# Altium footprint library CONN_HDR_1.27MM_ST.PcbLib: 116 footprints (part 5 of 9) (continued)
## HDRMINI_M_1X15 [mm] "mini header (50mil pitch)" (continued)
3D body: height 7.3, standoff -2.5, extent 6.15,-0.2 6.55,0.2
3D body: height 2.8, standoff 0, extent 4.445,-0.635 5.715,0.635
3D body: height 7.3, standoff -2.5, extent 4.88,-0.2 5.28,0.2
3D body: height 2.8, standoff 0, extent 3.175,-0.635 4.445,0.635
3D body: height 7.3, standoff -2.5, extent 3.61,-0.2 4.01,0.2

## HDRMINI_M_1X16 [mm] "mini header (50mil pitch)"
pads (16):
  round 1 / inner round 1 / far side oval 1x1.4 hole 0.7 mask+0.05: 1(-9.525,0) 2(-8.255,0) 3(-6.985,0) 4(-5.715,0) 5(-4.445,0) 6(-3.175,0) 7(-1.905,0) 8(-0.635,0) 9(0.635,0) 10(1.905,0) 11(3.175,0) 12(4.445,0) 13(5.715,0) 14(6.985,0) 15(8.255,0) 16(9.525,0)
Top Overlay:
  circle w0.2: c-10.668,0 r0.2
  lines w0.2: -10.16,-0.635 -10.061,-0.8 -8.989,-0.8 -8.89,-0.635 -8.791,-0.8 -7.719,-0.8 -7.62,-0.635 -7.521,-0.8 -6.449,-0.8 -6.35,-0.635 -6.251,-0.8 -5.179,-0.8 -5.08,-0.635 -4.981,-0.8 -3.909,-0.8 -3.81,-0.635 -3.711,-0.8 -2.639,-0.8 -2.54,-0.635 -2.441,-0.8 -1.369,-0.8 -1.27,-0.635 -1.171,-0.8 -0.099,-0.8 0,-0.635 0.099,-0.8 1.171,-0.8 1.27,-0.635 1.369,-0.8 2.441,-0.8 2.54,-0.635 2.639,-0.8 3.711,-0.8 3.81,-0.635 3.91,-0.8 4.982,-0.8 5.081,-0.635 5.18,-0.8 6.252,-0.8 6.351,-0.635 6.45,-0.8 7.522,-0.8 7.621,-0.635 7.72,-0.8 8.792,-0.8 8.891,-0.635 8.99,-0.8 10.062,-0.8 10.161,-0.635 10.161,0.635 10.062,0.8 8.99,0.8 8.891,0.635 8.792,0.8 7.72,0.8 7.621,0.635 7.522,0.8 6.45,0.8 6.351,0.635 6.252,0.8 5.18,0.8 5.081,0.635 4.982,0.8 3.91,0.8 3.811,0.635 3.711,0.8 2.639,0.8 2.54,0.635 2.441,0.8 1.369,0.8 1.27,0.635 1.171,0.8 0.099,0.8 0,0.635 -0.099,0.8 -1.171,0.8 -1.27,0.635 -1.369,0.8 -2.441,0.8 -2.54,0.635 -2.639,0.8 -3.711,0.8 -3.81,0.635 -3.909,0.8 -4.981,0.8 -5.08,0.635 -5.179,0.8 -6.251,0.8 -6.35,0.635 -6.449,0.8 -7.521,0.8 -7.62,0.635 -7.719,0.8 -8.791,0.8 -8.89,0.635 -8.989,0.8 -10.061,0.8 -10.16,0.635 -10.16,-0.635
3D body: height 2.8, standoff 0, extent 0,-0.635 1.27,0.635
3D body: height 7.3, standoff -2.5, extent 0.435,-0.2 0.835,0.2
3D body: height 2.8, standoff 0, extent -1.27,-0.635 0,0.635
3D body: height 7.3, standoff -2.5, extent -0.835,-0.2 -0.435,0.2
3D body: height 2.8, standoff 0, extent -2.54,-0.635 -1.27,0.635
3D body: height 7.3, standoff -2.5, extent -2.105,-0.2 -1.705,0.2
3D body: height 2.8, standoff 0, extent -3.81,-0.635 -2.54,0.635
3D body: height 7.3, standoff -2.5, extent -3.375,-0.2 -2.975,0.2
3D body: height 2.8, standoff 0, extent -5.08,-0.635 -3.81,0.635
3D body: height 7.3, standoff -2.5, extent -4.645,-0.2 -4.245,0.2
3D body: height 2.8, standoff 0, extent -6.35,-0.635 -5.08,0.635
3D body: height 7.3, standoff -2.5, extent -5.915,-0.2 -5.515,0.2
3D body: height 2.8, standoff 0, extent -7.62,-0.635 -6.35,0.635
3D body: height 7.3, standoff -2.5, extent -7.185,-0.2 -6.785,0.2
3D body: height 2.8, standoff 0, extent -8.89,-0.635 -7.62,0.635
3D body: height 7.3, standoff -2.5, extent -8.455,-0.2 -8.055,0.2
3D body: height 2.8, standoff 0, extent -10.16,-0.635 -8.89,0.635
3D body: height 7.3, standoff -2.5, extent -9.725,-0.2 -9.325,0.2
3D body: height 2.8, standoff 0, extent 1.27,-0.635 2.54,0.635
3D body: height 7.3, standoff -2.5, extent 1.705,-0.2 2.105,0.2
3D body: height 2.8, standoff 0, extent 8.89,-0.635 10.16,0.635
3D body: height 7.3, standoff -2.5, extent 9.325,-0.2 9.725,0.2
3D body: height 2.8, standoff 0, extent 7.62,-0.635 8.89,0.635
3D body: height 7.3, standoff -2.5, extent 8.055,-0.2 8.455,0.2
3D body: height 2.8, standoff 0, extent 6.35,-0.635 7.62,0.635
3D body: height 7.3, standoff -2.5, extent 6.785,-0.2 7.185,0.2
3D body: height 2.8, standoff 0, extent 5.08,-0.635 6.35,0.635
3D body: height 7.3, standoff -2.5, extent 5.515,-0.2 5.915,0.2
3D body: height 2.8, standoff 0, extent 3.81,-0.635 5.08,0.635
3D body: height 7.3, standoff -2.5, extent 4.245,-0.2 4.645,0.2
3D body: height 2.8, standoff 0, extent 2.54,-0.635 3.81,0.635
3D body: height 7.3, standoff -2.5, extent 2.975,-0.2 3.375,0.2

## HDRMINI_M_1X17 [mm] "mini header (50mil pitch)"
pads (17):
  round 1 / inner round 1 / far side oval 1x1.4 hole 0.7 mask+0.05: 1(-10.16,0) 2(-8.89,0) 3(-7.62,0) 4(-6.35,0) 5(-5.08,0) 6(-3.81,0) 7(-2.54,0) 8(-1.27,0) 9(0,0) 10(1.27,0) 11(2.54,0) 12(3.81,0) 13(5.08,0) 14(6.35,0) 15(7.62,0) 16(8.89,0) 17(10.16,0)
Top Overlay:
  circle w0.2: c-11.303,0 r0.2
  lines w0.2: -10.795,-0.635 -10.696,-0.8 -9.624,-0.8 -9.525,-0.635 -9.426,-0.8 -8.354,-0.8 -8.255,-0.635 -8.156,-0.8 -7.084,-0.8 -6.985,-0.635 -6.886,-0.8 -5.814,-0.8 -5.715,-0.635 -5.616,-0.8 -4.544,-0.8 -4.445,-0.635 -4.346,-0.8 -3.274,-0.8 -3.175,-0.635 -3.076,-0.8 -2.004,-0.8 -1.905,-0.635 -1.806,-0.8 -0.734,-0.8 -0.635,-0.635 -0.536,-0.8 0.536,-0.8 0.635,-0.635 0.734,-0.8 1.806,-0.8 1.905,-0.635 2.004,-0.8 3.076,-0.8 3.175,-0.635 3.275,-0.8 4.347,-0.8 4.446,-0.635 4.545,-0.8 5.617,-0.8 5.716,-0.635 5.815,-0.8 6.887,-0.8 6.986,-0.635 7.085,-0.8 8.157,-0.8 8.256,-0.635 8.355,-0.8 9.427,-0.8 9.526,-0.635 9.625,-0.8 10.697,-0.8 10.796,-0.635 10.796,0.635 10.697,0.8 9.625,0.8 9.526,0.635 9.427,0.8 8.355,0.8 8.256,0.635 8.157,0.8 7.085,0.8 6.986,0.635 6.887,0.8 5.815,0.8 5.716,0.635 5.617,0.8 4.545,0.8 4.446,0.635 4.347,0.8 3.275,0.8 3.176,0.635 3.076,0.8 2.004,0.8 1.905,0.635 1.806,0.8 0.734,0.8 0.635,0.635 0.536,0.8 -0.536,0.8 -0.635,0.635 -0.734,0.8 -1.806,0.8 -1.905,0.635 -2.004,0.8 -3.076,0.8 -3.175,0.635 -3.274,0.8 -4.346,0.8 -4.445,0.635 -4.544,0.8 -5.616,0.8 -5.715,0.635 -5.814,0.8 -6.886,0.8 -6.985,0.635 -7.084,0.8 -8.156,0.8 -8.255,0.635 -8.354,0.8 -9.426,0.8 -9.525,0.635 -9.624,0.8 -10.696,0.8 -10.795,0.635 -10.795,-0.635
3D body: height 2.8, standoff 0, extent -0.635,-0.635 0.635,0.635
3D body: height 7.3, standoff -2.5, extent -0.2,-0.2 0.2,0.2
3D body: height 2.8, standoff 0, extent -1.905,-0.635 -0.635,0.635
3D body: height 7.3, standoff -2.5, extent -1.47,-0.2 -1.07,0.2
3D body: height 2.8, standoff 0, extent -3.175,-0.635 -1.905,0.635
3D body: height 7.3, standoff -2.5, extent -2.74,-0.2 -2.34,0.2
3D body: height 2.8, standoff 0, extent -4.445,-0.635 -3.175,0.635
3D body: height 7.3, standoff -2.5, extent -4.01,-0.2 -3.61,0.2
3D body: height 2.8, standoff 0, extent -5.715,-0.635 -4.445,0.635
3D body: height 7.3, standoff -2.5, extent -5.28,-0.2 -4.88,0.2
3D body: height 2.8, standoff 0, extent -6.985,-0.635 -5.715,0.635
3D body: height 7.3, standoff -2.5, extent -6.55,-0.2 -6.15,0.2
3D body: height 2.8, standoff 0, extent -8.255,-0.635 -6.985,0.635
3D body: height 7.3, standoff -2.5, extent -7.82,-0.2 -7.42,0.2
3D body: height 2.8, standoff 0, extent -9.525,-0.635 -8.255,0.635
3D body: height 7.3, standoff -2.5, extent -9.09,-0.2 -8.69,0.2
3D body: height 2.8, standoff 0, extent -10.795,-0.635 -9.525,0.635
3D body: height 7.3, standoff -2.5, extent -10.36,-0.2 -9.96,0.2
3D body: height 2.8, standoff 0, extent 0.635,-0.635 1.905,0.635
3D body: height 7.3, standoff -2.5, extent 1.07,-0.2 1.47,0.2
3D body: height 2.8, standoff 0, extent 9.525,-0.635 10.795,0.635
3D body: height 7.3, standoff -2.5, extent 9.96,-0.2 10.36,0.2
3D body: height 2.8, standoff 0, extent 8.255,-0.635 9.525,0.635
3D body: height 7.3, standoff -2.5, extent 8.69,-0.2 9.09,0.2
3D body: height 2.8, standoff 0, extent 6.985,-0.635 8.255,0.635
3D body: height 7.3, standoff -2.5, extent 7.42,-0.2 7.82,0.2
3D body: height 2.8, standoff 0, extent 5.715,-0.635 6.985,0.635
3D body: height 7.3, standoff -2.5, extent 6.15,-0.2 6.55,0.2
3D body: height 2.8, standoff 0, extent 4.445,-0.635 5.715,0.635
3D body: height 7.3, standoff -2.5, extent 4.88,-0.2 5.28,0.2
3D body: height 2.8, standoff 0, extent 3.175,-0.635 4.445,0.635
3D body: height 7.3, standoff -2.5, extent 3.61,-0.2 4.01,0.2
3D body: height 2.8, standoff 0, extent 1.905,-0.635 3.175,0.635
3D body: height 7.3, standoff -2.5, extent 2.34,-0.2 2.74,0.2

## HDRMINI_M_1X18 [mm] "mini header (50mil pitch)"
pads (18):
  round 1 / inner round 1 / far side oval 1x1.4 hole 0.7 mask+0.05: 1(-10.795,0) 2(-9.525,0) 3(-8.255,0) 4(-6.985,0) 5(-5.715,0) 6(-4.445,0) 7(-3.175,0) 8(-1.905,0) 9(-0.635,0) 10(0.635,0) 11(1.905,0) 12(3.175,0) 13(4.445,0) 14(5.715,0) 15(6.985,0) 16(8.255,0) 17(9.525,0) 18(10.795,0)
Top Overlay:
  circle w0.2: c-11.938,0 r0.2
  lines w0.2: -11.43,-0.635 -11.43,0.635 -11.331,0.8 -10.259,0.8 -10.16,0.635 -10.061,0.8 -8.989,0.8 -8.89,0.635 -8.791,0.8 -7.719,0.8 -7.62,0.635 -7.521,0.8 -6.449,0.8 -6.35,0.635 -6.251,0.8 -5.179,0.8 -5.08,0.635 -4.981,0.8 -3.909,0.8 -3.81,0.635 -3.711,0.8 -2.639,0.8 -2.54,0.635 -2.441,0.8 -1.369,0.8 -1.27,0.635 -1.171,0.8 -0.099,0.8 0,0.635 0.099,0.8 1.171,0.8 1.27,0.635 1.369,0.8 2.441,0.8 2.54,0.635 2.64,0.8 3.712,0.8 3.811,0.635 3.91,0.8 4.982,0.8 5.081,0.635 5.18,0.8 6.252,0.8 6.351,0.635 6.45,0.8 7.522,0.8 7.621,0.635 7.72,0.8 8.792,0.8 8.891,0.635 8.99,0.8 10.062,0.8 10.161,0.635 10.26,0.8 11.332,0.8 11.431,0.635 11.431,-0.635 11.332,-0.8 10.26,-0.8 10.161,-0.635 10.062,-0.8 8.99,-0.8 8.891,-0.635 8.792,-0.8 7.72,-0.8 7.621,-0.635 7.522,-0.8 6.45,-0.8 6.351,-0.635 6.252,-0.8 5.18,-0.8 5.081,-0.635 4.982,-0.8 3.91,-0.8 3.811,-0.635 3.712,-0.8 2.64,-0.8 2.541,-0.635 2.441,-0.8 1.369,-0.8 1.27,-0.635 1.171,-0.8 0.099,-0.8 0,-0.635 -0.099,-0.8 -1.171,-0.8 -1.27,-0.635 -1.369,-0.8 -2.441,-0.8 -2.54,-0.635 -2.639,-0.8 -3.711,-0.8 -3.81,-0.635 -3.909,-0.8 -4.981,-0.8 -5.08,-0.635 -5.179,-0.8 -6.251,-0.8 -6.35,-0.635 -6.449,-0.8 -7.521,-0.8 -7.62,-0.635 -7.719,-0.8 -8.791,-0.8 -8.89,-0.635 -8.989,-0.8 -10.061,-0.8 -10.16,-0.635 -10.259,-0.8 -11.331,-0.8 -11.43,-0.635
3D body: height 2.8, standoff 0, extent -1.27,-0.635 0,0.635
3D body: height 7.3, standoff -2.5, extent -0.835,-0.2 -0.435,0.2
3D body: height 2.8, standoff 0, extent -2.54,-0.635 -1.27,0.635
3D body: height 7.3, standoff -2.5, extent -2.105,-0.2 -1.705,0.2
3D body: height 2.8, standoff 0, extent -3.81,-0.635 -2.54,0.635
3D body: height 7.3, standoff -2.5, extent -3.375,-0.2 -2.975,0.2
3D body: height 2.8, standoff 0, extent -5.08,-0.635 -3.81,0.635
3D body: height 7.3, standoff -2.5, extent -4.645,-0.2 -4.245,0.2
3D body: height 2.8, standoff 0, extent -6.35,-0.635 -5.08,0.635
3D body: height 7.3, standoff -2.5, extent -5.915,-0.2 -5.515,0.2
3D body: height 2.8, standoff 0, extent -7.62,-0.635 -6.35,0.635
3D body: height 7.3, standoff -2.5, extent -7.185,-0.2 -6.785,0.2
3D body: height 2.8, standoff 0, extent -8.89,-0.635 -7.62,0.635
3D body: height 7.3, standoff -2.5, extent -8.455,-0.2 -8.055,0.2
3D body: height 2.8, standoff 0, extent -10.16,-0.635 -8.89,0.635
3D body: height 7.3, standoff -2.5, extent -9.725,-0.2 -9.325,0.2
3D body: height 2.8, standoff 0, extent -11.43,-0.635 -10.16,0.635
3D body: height 7.3, standoff -2.5, extent -10.995,-0.2 -10.595,0.2
3D body: height 2.8, standoff 0, extent 0,-0.635 1.27,0.635
3D body: height 7.3, standoff -2.5, extent 0.435,-0.2 0.835,0.2
3D body: height 2.8, standoff 0, extent 10.16,-0.635 11.43,0.635
3D body: height 7.3, standoff -2.5, extent 10.595,-0.2 10.995,0.2
3D body: height 2.8, standoff 0, extent 8.89,-0.635 10.16,0.635
3D body: height 7.3, standoff -2.5, extent 9.325,-0.2 9.725,0.2
3D body: height 2.8, standoff 0, extent 7.62,-0.635 8.89,0.635
3D body: height 7.3, standoff -2.5, extent 8.055,-0.2 8.455,0.2
3D body: height 2.8, standoff 0, extent 6.35,-0.635 7.62,0.635
3D body: height 7.3, standoff -2.5, extent 6.785,-0.2 7.185,0.2
3D body: height 2.8, standoff 0, extent 5.08,-0.635 6.35,0.635
3D body: height 7.3, standoff -2.5, extent 5.515,-0.2 5.915,0.2
3D body: height 2.8, standoff 0, extent 3.81,-0.635 5.08,0.635
3D body: height 7.3, standoff -2.5, extent 4.245,-0.2 4.645,0.2
3D body: height 2.8, standoff 0, extent 2.54,-0.635 3.81,0.635
3D body: height 7.3, standoff -2.5, extent 2.975,-0.2 3.375,0.2
3D body: height 2.8, standoff 0, extent 1.27,-0.635 2.54,0.635
3D body: height 7.3, standoff -2.5, extent 1.705,-0.2 2.105,0.2

## HDRMINI_M_1X19 [mm] "mini header (50mil pitch)"
pads (19):
  round 1 / inner round 1 / far side oval 1x1.4 hole 0.7 mask+0.05: 1(-11.43,0) 2(-10.16,0) 3(-8.89,0) 4(-7.62,0) 5(-6.35,0) 6(-5.08,0) 7(-3.81,0) 8(-2.54,0) 9(-1.27,0) 10(0,0) 11(1.27,0) 12(2.54,0) 13(3.81,0) 14(5.08,0) 15(6.35,0) 16(7.62,0) 17(8.89,0) 18(10.16,0) 19(11.43,0)
Top Overlay:
  circle w0.2: c-12.573,0 r0.2
  lines w0.2: -12.065,-0.635 -12.065,0.635 -11.966,0.8 -10.894,0.8 -10.795,0.635 -10.696,0.8 -9.624,0.8 -9.525,0.635 -9.426,0.8 -8.354,0.8 -8.255,0.635 -8.156,0.8 -7.084,0.8 -6.985,0.635 -6.886,0.8 -5.814,0.8 -5.715,0.635 -5.616,0.8 -4.544,0.8 -4.445,0.635 -4.346,0.8 -3.274,0.8 -3.175,0.635 -3.076,0.8 -2.004,0.8 -1.905,0.635 -1.806,0.8 -0.734,0.8 -0.635,0.635 -0.536,0.8 0.536,0.8 0.635,0.635 0.734,0.8 1.806,0.8 1.905,0.635 2.005,0.8 3.077,0.8 3.176,0.635 3.275,0.8 4.347,0.8 4.446,0.635 4.545,0.8 5.617,0.8 5.716,0.635 5.815,0.8 6.887,0.8 6.986,0.635 7.085,0.8 8.157,0.8 8.256,0.635 8.355,0.8 9.427,0.8 9.526,0.635 9.625,0.8 10.697,0.8 10.796,0.635 10.895,0.8 11.967,0.8 12.066,0.635 12.066,-0.635 11.967,-0.8 10.895,-0.8 10.796,-0.635 10.697,-0.8 9.625,-0.8 9.526,-0.635 9.427,-0.8 8.355,-0.8 8.256,-0.635 8.157,-0.8 7.085,-0.8 6.986,-0.635 6.887,-0.8 5.815,-0.8 5.716,-0.635 5.617,-0.8 4.545,-0.8 4.446,-0.635 4.347,-0.8 3.275,-0.8 3.176,-0.635 3.077,-0.8 2.005,-0.8 1.906,-0.635 1.806,-0.8 0.734,-0.8 0.635,-0.635 0.536,-0.8 -0.536,-0.8 -0.635,-0.635 -0.734,-0.8 -1.806,-0.8 -1.905,-0.635 -2.004,-0.8 -3.076,-0.8 -3.175,-0.635 -3.274,-0.8 -4.346,-0.8 -4.445,-0.635 -4.544,-0.8 -5.616,-0.8 -5.715,-0.635 -5.814,-0.8 -6.886,-0.8 -6.985,-0.635 -7.084,-0.8 -8.156,-0.8 -8.255,-0.635 -8.354,-0.8 -9.426,-0.8 -9.525,-0.635 -9.624,-0.8 -10.696,-0.8 -10.795,-0.635 -10.894,-0.8 -11.966,-0.8 -12.065,-0.635
3D body: height 2.8, standoff 0, extent -1.905,-0.635 -0.635,0.635
3D body: height 7.3, standoff -2.5, extent -1.47,-0.2 -1.07,0.2
3D body: height 2.8, standoff 0, extent -3.175,-0.635 -1.905,0.635
3D body: height 7.3, standoff -2.5, extent -2.74,-0.2 -2.34,0.2
3D body: height 2.8, standoff 0, extent -4.445,-0.635 -3.175,0.635
3D body: height 7.3, standoff -2.5, extent -4.01,-0.2 -3.61,0.2
3D body: height 2.8, standoff 0, extent -5.715,-0.635 -4.445,0.635
3D body: height 7.3, standoff -2.5, extent -5.28,-0.2 -4.88,0.2
3D body: height 2.8, standoff 0, extent -6.985,-0.635 -5.715,0.635
3D body: height 7.3, standoff -2.5, extent -6.55,-0.2 -6.15,0.2
3D body: height 2.8, standoff 0, extent -8.255,-0.635 -6.985,0.635
3D body: height 7.3, standoff -2.5, extent -7.82,-0.2 -7.42,0.2
3D body: height 2.8, standoff 0, extent -9.525,-0.635 -8.255,0.635
3D body: height 7.3, standoff -2.5, extent -9.09,-0.2 -8.69,0.2
3D body: height 2.8, standoff 0, extent -10.795,-0.635 -9.525,0.635
3D body: height 7.3, standoff -2.5, extent -10.36,-0.2 -9.96,0.2
3D body: height 2.8, standoff 0, extent -12.065,-0.635 -10.795,0.635
3D body: height 7.3, standoff -2.5, extent -11.63,-0.2 -11.23,0.2
3D body: height 2.8, standoff 0, extent -0.635,-0.635 0.635,0.635
3D body: height 7.3, standoff -2.5, extent -0.2,-0.2 0.2,0.2
3D body: height 2.8, standoff 0, extent 10.795,-0.635 12.065,0.635
3D body: height 7.3, standoff -2.5, extent 11.23,-0.2 11.63,0.2
3D body: height 2.8, standoff 0, extent 9.525,-0.635 10.795,0.635
3D body: height 7.3, standoff -2.5, extent 9.96,-0.2 10.36,0.2
3D body: height 2.8, standoff 0, extent 8.255,-0.635 9.525,0.635
3D body: height 7.3, standoff -2.5, extent 8.69,-0.2 9.09,0.2
3D body: height 2.8, standoff 0, extent 6.985,-0.635 8.255,0.635
3D body: height 7.3, standoff -2.5, extent 7.42,-0.2 7.82,0.2
3D body: height 2.8, standoff 0, extent 5.715,-0.635 6.985,0.635
3D body: height 7.3, standoff -2.5, extent 6.15,-0.2 6.55,0.2
3D body: height 2.8, standoff 0, extent 4.445,-0.635 5.715,0.635
3D body: height 7.3, standoff -2.5, extent 4.88,-0.2 5.28,0.2
3D body: height 2.8, standoff 0, extent 3.175,-0.635 4.445,0.635
3D body: height 7.3, standoff -2.5, extent 3.61,-0.2 4.01,0.2
3D body: height 2.8, standoff 0, extent 1.905,-0.635 3.175,0.635
3D body: height 7.3, standoff -2.5, extent 2.34,-0.2 2.74,0.2
3D body: height 2.8, standoff 0, extent 0.635,-0.635 1.905,0.635
3D body: height 7.3, standoff -2.5, extent 1.07,-0.2 1.47,0.2

## HDRMINI_M_1X20 [mm] "mini header (50mil pitch)"
pads (20):
  round 1 / inner round 1 / far side oval 1x1.4 hole 0.7 mask+0.05: 1(-12.065,0) 2(-10.795,0) 3(-9.525,0) 4(-8.255,0) 5(-6.985,0) 6(-5.715,0) 7(-4.445,0) 8(-3.175,0) 9(-1.905,0) 10(-0.635,0) 11(0.635,0) 12(1.905,0) 13(3.175,0) 14(4.445,0) 15(5.715,0) 16(6.985,0) 17(8.255,0) 18(9.525,0) 19(10.795,0) 20(12.065,0)
Top Overlay:
  circle w0.2: c-13.208,0 r0.2
  lines w0.2: -12.7,-0.635 -12.601,-0.8 -11.529,-0.8 -11.43,-0.635 -11.331,-0.8 -10.259,-0.8 -10.16,-0.635 -10.061,-0.8 -8.989,-0.8 -8.89,-0.635 -8.791,-0.8 -7.719,-0.8 -7.62,-0.635 -7.521,-0.8 -6.449,-0.8 -6.35,-0.635 -6.251,-0.8 -5.179,-0.8 -5.08,-0.635 -4.981,-0.8 -3.909,-0.8 -3.81,-0.635 -3.711,-0.8 -2.639,-0.8 -2.54,-0.635 -2.441,-0.8 -1.369,-0.8 -1.27,-0.635 -1.171,-0.8 -0.099,-0.8 0,-0.635 0.099,-0.8 1.171,-0.8 1.27,-0.635 1.37,-0.8 2.442,-0.8 2.541,-0.635 2.64,-0.8 3.712,-0.8 3.811,-0.635 3.91,-0.8 4.982,-0.8 5.081,-0.635 5.18,-0.8 6.252,-0.8 6.351,-0.635 6.45,-0.8 7.522,-0.8 7.621,-0.635 7.72,-0.8 8.792,-0.8 8.891,-0.635 8.99,-0.8 10.062,-0.8 10.161,-0.635 10.26,-0.8 11.332,-0.8 11.431,-0.635 11.53,-0.8 12.602,-0.8 12.701,-0.635 12.701,0.635 12.602,0.8 11.53,0.8 11.431,0.635 11.332,0.8 10.26,0.8 10.161,0.635 10.062,0.8 8.99,0.8 8.891,0.635 8.792,0.8 7.72,0.8 7.621,0.635 7.522,0.8 6.45,0.8 6.351,0.635 6.252,0.8 5.18,0.8 5.081,0.635 4.982,0.8 3.91,0.8 3.811,0.635 3.712,0.8 2.64,0.8 2.541,0.635 2.442,0.8 1.37,0.8 1.271,0.635 1.171,0.8 0.099,0.8 0,0.635 -0.099,0.8 -1.171,0.8 -1.27,0.635 -1.369,0.8 -2.441,0.8 -2.54,0.635 -2.639,0.8 -3.711,0.8 -3.81,0.635 -3.909,0.8 -4.981,0.8 -5.08,0.635 -5.179,0.8 -6.251,0.8 -6.35,0.635 -6.449,0.8 -7.521,0.8 -7.62,0.635 -7.719,0.8 -8.791,0.8 -8.89,0.635 -8.989,0.8 -10.061,0.8 -10.16,0.635 -10.259,0.8 -11.331,0.8 -11.43,0.635 -11.529,0.8 -12.601,0.8 -12.7,0.635 -12.7,-0.635
3D body: height 7.3, standoff -2.5, extent 11.865,-0.2 12.265,0.2
3D body: height 2.8, standoff 0, extent 11.43,-0.635 12.7,0.635
3D body: height 7.3, standoff -2.5, extent 0.435,-0.2 0.835,0.2
3D body: height 2.8, standoff 0, extent 0,-0.635 1.27,0.635
3D body: height 7.3, standoff -2.5, extent 1.705,-0.2 2.105,0.2
3D body: height 2.8, standoff 0, extent 1.27,-0.635 2.54,0.635
3D body: height 7.3, standoff -2.5, extent 2.975,-0.2 3.375,0.2
3D body: height 2.8, standoff 0, extent 2.54,-0.635 3.81,0.635
3D body: height 7.3, standoff -2.5, extent 4.245,-0.2 4.645,0.2
3D body: height 2.8, standoff 0, extent 3.81,-0.635 5.08,0.635
3D body: height 7.3, standoff -2.5, extent 5.515,-0.2 5.915,0.2
3D body: height 2.8, standoff 0, extent 5.08,-0.635 6.35,0.635
3D body: height 7.3, standoff -2.5, extent 6.785,-0.2 7.185,0.2
3D body: height 2.8, standoff 0, extent 6.35,-0.635 7.62,0.635
3D body: height 7.3, standoff -2.5, extent 8.055,-0.2 8.455,0.2
3D body: height 2.8, standoff 0, extent 7.62,-0.635 8.89,0.635
3D body: height 7.3, standoff -2.5, extent 9.325,-0.2 9.725,0.2
3D body: height 2.8, standoff 0, extent 8.89,-0.635 10.16,0.635
3D body: height 7.3, standoff -2.5, extent 10.595,-0.2 10.995,0.2
3D body: height 2.8, standoff 0, extent 10.16,-0.635 11.43,0.635
3D body: height 7.3, standoff -2.5, extent -0.835,-0.2 -0.435,0.2
3D body: height 2.8, standoff 0, extent -1.27,-0.635 0,0.635
3D body: height 7.3, standoff -2.5, extent -12.265,-0.2 -11.865,0.2
3D body: height 2.8, standoff 0, extent -12.7,-0.635 -11.43,0.635
3D body: height 7.3, standoff -2.5, extent -10.995,-0.2 -10.595,0.2
3D body: height 2.8, standoff 0, extent -11.43,-0.635 -10.16,0.635
3D body: height 7.3, standoff -2.5, extent -9.725,-0.2 -9.325,0.2
3D body: height 2.8, standoff 0, extent -10.16,-0.635 -8.89,0.635
3D body: height 7.3, standoff -2.5, extent -8.455,-0.2 -8.055,0.2
3D body: height 2.8, standoff 0, extent -8.89,-0.635 -7.62,0.635
3D body: height 7.3, standoff -2.5, extent -7.185,-0.2 -6.785,0.2
3D body: height 2.8, standoff 0, extent -7.62,-0.635 -6.35,0.635
3D body: height 7.3, standoff -2.5, extent -5.915,-0.2 -5.515,0.2
3D body: height 2.8, standoff 0, extent -6.35,-0.635 -5.08,0.635
3D body: height 7.3, standoff -2.5, extent -4.645,-0.2 -4.245,0.2
3D body: height 2.8, standoff 0, extent -5.08,-0.635 -3.81,0.635
3D body: height 7.3, standoff -2.5, extent -3.375,-0.2 -2.975,0.2
3D body: height 2.8, standoff 0, extent -3.81,-0.635 -2.54,0.635
3D body: height 7.3, standoff -2.5, extent -2.105,-0.2 -1.705,0.2
3D body: height 2.8, standoff 0, extent -2.54,-0.635 -1.27,0.635

## HDRMINI_M_1X21 [mm] "mini header (50mil pitch)"
pads (21):
  round 1 / inner round 1 / far side oval 1x1.4 hole 0.7 mask+0.05: 1(-12.7,0) 2(-11.43,0) 3(-10.16,0) 4(-8.89,0) 5(-7.62,0) 6(-6.35,0) 7(-5.08,0) 8(-3.81,0) 9(-2.54,0) 10(-1.27,0) 11(0,0) 12(1.27,0) 13(2.54,0) 14(3.81,0) 15(5.08,0) 16(6.35,0) 17(7.62,0) 18(8.89,0) 19(10.16,0) 20(11.43,0) 21(12.7,0)
Top Overlay:
  circle w0.2: c-13.843,0 r0.2
  lines w0.2: -13.335,-0.635 -13.335,0.635 -13.236,0.8 -12.164,0.8 -12.065,0.635 -11.966,0.8 -10.894,0.8 -10.795,0.635 -10.696,0.8 -9.624,0.8 -9.525,0.635 -9.426,0.8 -8.354,0.8 -8.255,0.635 -8.156,0.8 -7.084,0.8 -6.985,0.635 -6.886,0.8 -5.814,0.8 -5.715,0.635 -5.616,0.8 -4.544,0.8 -4.445,0.635 -4.346,0.8 -3.274,0.8 -3.175,0.635 -3.076,0.8 -2.004,0.8 -1.905,0.635 -1.806,0.8 -0.734,0.8 -0.635,0.635 -0.536,0.8 0.536,0.8 0.635,0.635 0.735,0.8 1.807,0.8 1.906,0.635 2.005,0.8 3.077,0.8 3.176,0.635 3.275,0.8 4.347,0.8 4.446,0.635 4.545,0.8 5.617,0.8 5.716,0.635 5.815,0.8 6.887,0.8 6.986,0.635 7.085,0.8 8.157,0.8 8.256,0.635 8.355,0.8 9.427,0.8 9.526,0.635 9.625,0.8 10.697,0.8 10.796,0.635 10.895,0.8 11.967,0.8 12.066,0.635 12.165,0.8 13.237,0.8 13.336,0.635 13.336,-0.635 13.237,-0.8 12.165,-0.8 12.066,-0.635 11.967,-0.8 10.895,-0.8 10.796,-0.635 10.697,-0.8 9.625,-0.8 9.526,-0.635 9.427,-0.8 8.355,-0.8 8.256,-0.635 8.157,-0.8 7.085,-0.8 6.986,-0.635 6.887,-0.8 5.815,-0.8 5.716,-0.635 5.617,-0.8 4.545,-0.8 4.446,-0.635 4.347,-0.8 3.275,-0.8 3.176,-0.635 3.077,-0.8 2.005,-0.8 1.906,-0.635 1.807,-0.8 0.735,-0.8 0.636,-0.635 0.536,-0.8 -0.536,-0.8 -0.635,-0.635 -0.734,-0.8 -1.806,-0.8 -1.905,-0.635 -2.004,-0.8 -3.076,-0.8 -3.175,-0.635 -3.274,-0.8 -4.346,-0.8 -4.445,-0.635 -4.544,-0.8 -5.616,-0.8 -5.715,-0.635 -5.814,-0.8 -6.886,-0.8 -6.985,-0.635 -7.084,-0.8 -8.156,-0.8 -8.255,-0.635 -8.354,-0.8 -9.426,-0.8 -9.525,-0.635 -9.624,-0.8 -10.696,-0.8 -10.795,-0.635 -10.894,-0.8 -11.966,-0.8 -12.065,-0.635 -12.164,-0.8 -13.236,-0.8 -13.335,-0.635
3D body: height 7.3, standoff -2.5, extent 11.23,-0.2 11.63,0.2
3D body: height 2.8, standoff 0, extent 10.795,-0.635 12.065,0.635
3D body: height 7.3, standoff -2.5, extent -0.2,-0.2 0.2,0.2
3D body: height 2.8, standoff 0, extent -0.635,-0.635 0.635,0.635
3D body: height 7.3, standoff -2.5, extent 1.07,-0.2 1.47,0.2
3D body: height 2.8, standoff 0, extent 0.635,-0.635 1.905,0.635
3D body: height 7.3, standoff -2.5, extent 2.34,-0.2 2.74,0.2
3D body: height 2.8, standoff 0, extent 1.905,-0.635 3.175,0.635
3D body: height 7.3, standoff -2.5, extent 3.61,-0.2 4.01,0.2
3D body: height 2.8, standoff 0, extent 3.175,-0.635 4.445,0.635
3D body: height 7.3, standoff -2.5, extent 4.88,-0.2 5.28,0.2
3D body: height 2.8, standoff 0, extent 4.445,-0.635 5.715,0.635
3D body: height 7.3, standoff -2.5, extent 6.15,-0.2 6.55,0.2
3D body: height 2.8, standoff 0, extent 5.715,-0.635 6.985,0.635
3D body: height 7.3, standoff -2.5, extent 7.42,-0.2 7.82,0.2
3D body: height 2.8, standoff 0, extent 6.985,-0.635 8.255,0.635
3D body: height 7.3, standoff -2.5, extent 8.69,-0.2 9.09,0.2
3D body: height 2.8, standoff 0, extent 8.255,-0.635 9.525,0.635
3D body: height 7.3, standoff -2.5, extent 9.96,-0.2 10.36,0.2
3D body: height 2.8, standoff 0, extent 9.525,-0.635 10.795,0.635
3D body: height 7.3, standoff -2.5, extent -1.47,-0.2 -1.07,0.2
3D body: height 2.8, standoff 0, extent -1.905,-0.635 -0.635,0.635
3D body: height 7.3, standoff -2.5, extent -12.9,-0.2 -12.5,0.2
3D body: height 2.8, standoff 0, extent -13.335,-0.635 -12.065,0.635
3D body: height 7.3, standoff -2.5, extent -11.63,-0.2 -11.23,0.2
3D body: height 2.8, standoff 0, extent -12.065,-0.635 -10.795,0.635
3D body: height 7.3, standoff -2.5, extent -10.36,-0.2 -9.96,0.2
3D body: height 2.8, standoff 0, extent -10.795,-0.635 -9.525,0.635
3D body: height 7.3, standoff -2.5, extent -9.09,-0.2 -8.69,0.2
3D body: height 2.8, standoff 0, extent -9.525,-0.635 -8.255,0.635
3D body: height 7.3, standoff -2.5, extent -7.82,-0.2 -7.42,0.2
3D body: height 2.8, standoff 0, extent -8.255,-0.635 -6.985,0.635
3D body: height 7.3, standoff -2.5, extent -6.55,-0.2 -6.15,0.2
3D body: height 2.8, standoff 0, extent -6.985,-0.635 -5.715,0.635
3D body: height 7.3, standoff -2.5, extent -5.28,-0.2 -4.88,0.2
3D body: height 2.8, standoff 0, extent -5.715,-0.635 -4.445,0.635
3D body: height 7.3, standoff -2.5, extent -4.01,-0.2 -3.61,0.2
3D body: height 2.8, standoff 0, extent -4.445,-0.635 -3.175,0.635
3D body: height 7.3, standoff -2.5, extent -2.74,-0.2 -2.34,0.2
3D body: height 2.8, standoff 0, extent -3.175,-0.635 -1.905,0.635
3D body: height 2.8, standoff 0, extent 12.065,-0.635 13.335,0.635
3D body: height 7.3, standoff -2.5, extent 12.5,-0.2 12.9,0.2